# Altium footprint library Footprints.PcbLib: 67 footprints (part 3 of 5)
Each footprint in its own frame and in the unit in brackets; x right, y up, seen from the top. Pads: shape width x height; smd on the part's side, far side on the other; paste and mask are expansions set on the pad; w line width, h text height; cw(c..) or ccw(c..) is an arc to the next point about the centre after c.
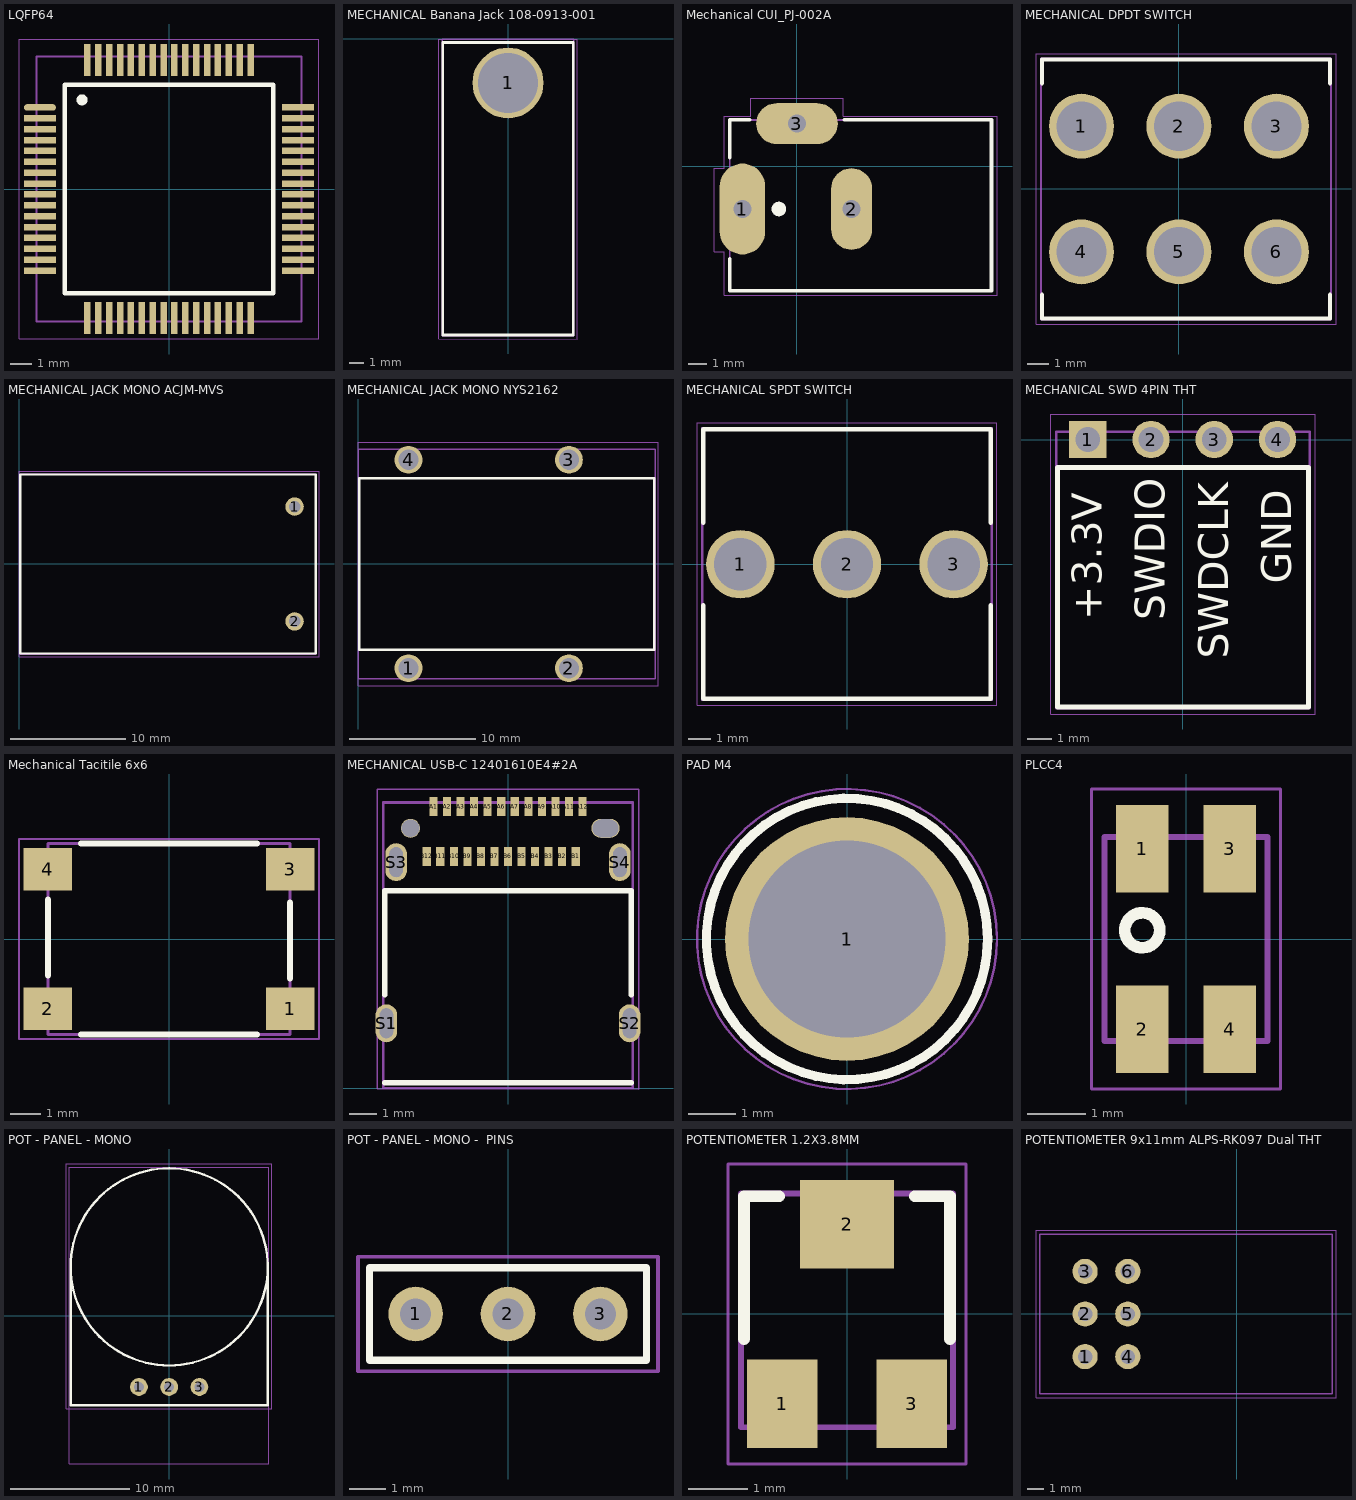
[diagram p2: the footprints below, top view; thin cyan lines are the x and y axes]

## LQFP64 [mm]
pads (64):
  oval 1.475x0.3 smd: 1(-5.938,3.75)
  rect 1.475x0.3 smd: 2(-5.938,3.25) 3(-5.938,2.75) 4(-5.938,2.25) 5(-5.938,1.75) 6(-5.938,1.25) 7(-5.938,0.75) 8(-5.938,0.25) 9(-5.938,-0.25) 10(-5.938,-0.75) 11(-5.938,-1.25) 12(-5.938,-1.75) 13(-5.938,-2.25) 14(-5.938,-2.75) 15(-5.938,-3.25) 16(-5.938,-3.75) 33(5.938,-3.75) 34(5.938,-3.25) 35(5.938,-2.75) 36(5.938,-2.25) 37(5.938,-1.75) 38(5.938,-1.25) 39(5.938,-0.75) 40(5.938,-0.25) 41(5.938,0.25) 42(5.938,0.75) 43(5.938,1.25) 44(5.938,1.75) 45(5.938,2.25) 46(5.938,2.75) 47(5.938,3.25) 48(5.938,3.75)
  rect 0.3x1.475 smd: 17(-3.75,-5.938) 18(-3.25,-5.938) 19(-2.75,-5.938) 20(-2.25,-5.938) 21(-1.75,-5.938) 22(-1.25,-5.938) 23(-0.75,-5.938) 24(-0.25,-5.938) 25(0.25,-5.938) 26(0.75,-5.938) 27(1.25,-5.938) 28(1.75,-5.938) 29(2.25,-5.938) 30(2.75,-5.938) 31(3.25,-5.938) 32(3.75,-5.938) 49(3.75,5.938) 50(3.25,5.938) 51(2.75,5.938) 52(2.25,5.938) 53(1.75,5.938) 54(1.25,5.938) 55(0.75,5.938) 56(0.25,5.938) 57(-0.25,5.938) 58(-0.75,5.938) 59(-1.25,5.938) 60(-1.75,5.938) 61(-2.25,5.938) 62(-2.75,5.938) 63(-3.25,5.938) 64(-3.75,5.938)
Top Overlay:
  circle w0.25: c-4,4.1 r0.125
  lines w0.2: -4.8,-4.8 -4.8,4.8 4.8,4.8 4.8,-4.8 -4.8,-4.8
Placement:
  lines w0.1: -6.1,-6.1 -6.1,6.1 6.1,6.1 6.1,3.856 6.1,1.106 6.1,-1.309 6.1,-3.831 6.1,-6.1 -6.1,-6.1
  text "'.Designator'" at -4,0 h1.2
Keep-Out:
  lines w0.05: -6.9,-6.9 -6.9,6.9 6.9,6.9 6.9,-6.9 -6.9,-6.9
3D body "Integrated Circuit LQFP64.STEP": height 1.62, standoff -0.01, extent -6.072,-6.072 6.072,6.072

## MECHANICAL Banana Jack 108-0913-001 [mm]
pads (1):
  round 5 hole 4.2: 1(0,-3.125)
Top Overlay:
  lines w0.2: -4.6,-20.9 4.6,-20.9 4.6,-0.275 -4.6,-0.275 -4.6,-20.9
Placement:
  lines w0.1: -4.65,-20.95 -4.65,-0.05 4.65,-0.05 4.65,-20.95 -4.65,-20.95
  text "'.Designator'" at 0.4,-19.7 h1.2
Keep-Out:
  lines w0.05: -4.875,-21.175 4.875,-21.175 4.875,-0.025 -4.875,-0.025 -4.875,-21.175
3D body "User Library-Banana plug 4mm.step": height 8.95, standoff -0.7, extent -4.65,-20.6 4.65,20.9

## Mechanical CUI_PJ-002A [mm]
pads (3):
  oval 2.5x5 hole 1 square: 1(-3,-2.35)
  oval 2.25x4.5 hole 1 square: 2(3,-2.35)
  oval 4.5x2.25 hole 1 square: 3(0,2.35)
Top Overlay:
  circle w0.4: c-1,-2.35 r0.2
  lines w0.2: -3.7,-5.1 -3.7,-6.85 10.7,-6.85 10.7,2.55 2.6,2.55 ; -3.7,0.475 -3.7,2.55 -2.6,2.55
Placement:
  lines w0.1: -3.7,-6.85 -3.7,2.55 10.7,2.55 10.7,-6.85 -3.7,-6.85
  text ".Designator" at -1.925,-2.25 h1
Keep-Out:
  lines w0.05: -4.55,-4.7 -4,-4.7 -4,-7.1 11,-7.1 11,2.75 2.55,2.75 2.55,3.75 -2.55,3.75 -2.55,2.75 -4,2.75 -4,-0.1 -4.55,-0.1 -4.55,-4.7
3D body "CUI_DEVICES_PJ-002A.step": height 11, standoff -3.5, extent -3.675,-6.85 10.725,2.55

## MECHANICAL DPDT SWITCH [mm]
pads (6):
  round 3 hole 2.3: 1(-4.5,2.9) 2(0,2.9) 3(4.5,2.9) 4(-4.5,-2.9) 5(0,-2.9) 6(4.5,-2.9)
Top Overlay:
  lines w0.2: -6.324,-4.885 -6.324,-5.976 -2.199,-5.976 6.975,-5.976 6.975,-4.885 ; -6.324,4.884 -6.324,5.975 6.975,5.975 6.975,4.884
Placement:
  lines w0.1: -6.375,-6.025 -6.375,6.025 7.025,6.025 7.025,-6.025 -6.375,-6.025
  text "'.Designator'" at -5.625,-0.275 h1.2
Keep-Out:
  lines w0.05: -6.6,-6.25 7.25,-6.25 7.25,6.25 -6.6,6.25 -6.6,-6.25
3D body "User Library-DPDT_O_N_O.STEP": height 28.83, standoff -3.17, extent -6.375,-6.032 7.024,6.033

## MECHANICAL JACK MONO ACJM-MVS [mm]
pads (2):
  round 1.6 hole 1: 1(24,5) 2(24,-5)
Top Overlay:
  lines w0.2: 0.1,-7.8 25.85,-7.8 25.85,7.8 0.1,7.8 0.1,-7.8
Placement:
  lines w0.1: 0.025,-7.85 25.9,-7.85 25.9,7.85 0.025,7.85 0.025,-7.85
  text "'.Designator'" at 1.1,-2.276 h6
Keep-Out:
  lines w0.05: 0,-8.075 0,8.075 26.125,8.075 26.125,-8.075 0,-8.075
3D body "ACJS-MN-2S.stp": height 16.8, standoff 1, extent -21.15,-7.9 25.95,7.9

## MECHANICAL JACK MONO NYS2162 [mm]
pads (4):
  round 2.2 hole 1.6: 1(4,-8.25) 2(16.7,-8.25) 3(16.7,8.25) 4(4,8.25)
Top Overlay:
  lines w0.2: 0.1,-6.8 23.45,-6.8 23.45,6.8 0.1,6.8 0.1,-6.8
Placement:
  lines w0.1: 0.025,-9.1 23.525,-9.1 23.525,9.1 0.025,9.1 0.025,-9.1
  text "'.Designator'" at 1.1,-2.276 h6
Keep-Out:
  lines w0.05: 0,-9.625 0,9.625 23.75,9.625 23.75,-9.625 0,-9.625
3D body "User Library-NMJ4HCD2.STEP": height 16.8, standoff -3.14, extent -8.264,-9.1 23.53,9.1

## MECHANICAL SPDT SWITCH [mm]
pads (3):
  round 3 hole 2.3: 1(-4.675,0) 2(0,0) 3(4.675,0)
Top Overlay:
  lines w0.2: -6.3,-1.8 -6.3,-5.9 -2.275,-5.9 6.3,-5.9 6.3,-1.8 ; -6.3,1.825 -6.3,5.925 6.3,5.925 6.3,1.825
Placement:
  lines w0.1: -6.35,-5.95 -6.35,5.975 6.35,5.975 6.35,-5.95 -6.35,-5.95
  text "'.Designator'" at -5.625,-0.275 h1.2
Keep-Out:
  lines w0.05: -6.575,-6.175 6.575,-6.175 6.575,6.2 -6.575,6.2 -6.575,-6.175
3D body "User Library-SWITCH SPDT_O_N_O.STEP": height 30.19, standoff -1.17, extent -6.35,-5.969 6.35,5.969

## MECHANICAL SWD 4PIN THT [mm]
pads (4):
  rect 1.5x1.5 hole 1: 1(-3.81,0)
  round 1.5 hole 1: 2(-1.27,0) 3(1.27,0) 4(3.81,0)
Top Overlay:
  lines w0.2: -5.025,-10.75 -5.025,-1.125 5.05,-1.125 5.05,-10.75 -5.025,-10.75
  text "GND" at 4.37,-5.8 h1.2
  text "SWDCLK" at 1.83,-8.8 h1.2
  text "SWDIO" at -0.71,-7.25 h1.2
  text "+3.3V" at -3.25,-7.25 h1.2
Placement:
  lines w0.1: -5.075,-10.8 5.1,-10.8 5.1,0.317 -5.075,0.317 -5.075,-10.8
  text "'.Designator'" at 0.575,-10.45 h1.2
Keep-Out:
  lines w0.05: -5.3,-11.025 -5.3,1.025 5.325,1.025 5.325,-11.025 -5.3,-11.025
3D body "826947-4.stp": height 3.25, standoff -3, extent -5.08,-10.8 5.08,0.315

## Mechanical Tacitile 6x6 [mm]
pads (4):
  rect 1.6x1.4 smd: 1(4,-2.3) 2(-4,-2.3) 3(4,2.3) 4(-4,2.3)
Top Overlay:
  lines w0.2: -4,-1.2 -4,1.3 ; -2.9,-3.15 2.9,-3.15 ; -2.9,3.15 2.9,3.15 ; 4,-1.3 4,1.2
Placement:
  lines w0.1: -4,-3.15 4,-3.15 4,3.15 -4,3.15 -4,-3.15
  text ".Designator" at -3.125,-0.175 h0.8
Keep-Out:
  lines w0.05: -4.95,-3.3 4.95,-3.3 4.95,3.3 -4.95,3.3 -4.95,-3.3
3D body "B3FS_1000.step": height 3, standoff -0.1, extent -4,-3.15 4,3.15

## MECHANICAL USB-C 12401610E4#2A [mm]
pads (30):
  rect 0.3x0.7 smd: A1(-2.75,10.4) A2(-2.25,10.4) A3(-1.75,10.4) A4(-1.25,10.4) A5(-0.75,10.4) A6(-0.25,10.4) A7(0.25,10.4) A8(0.75,10.4) A9(1.25,10.4) A10(1.75,10.4) A11(2.25,10.4) A12(2.75,10.4) B1(2.5,8.56) B2(2,8.56) B3(1.5,8.56) B4(1,8.56) B5(0.5,8.56) B6(0,8.56) B7(-0.5,8.56) B8(-1,8.56) B9(-1.5,8.56) B10(-2,8.56) B11(-2.5,8.56) B12(-3,8.56)
  oval 0.8x1.4 hole 1.1 slot 0.5 at 0 deg: S1(-4.49,2.4) S2(4.49,2.4) S3(-4.13,8.35) S4(4.13,8.35)
  round 0.7 hole 0.65 unplated: ""(-3.6,9.6)
  oval 1.05x0.7 hole 0.65 slot 0.95 at 0 deg unplated: ""(3.6,9.6)
Top Overlay:
  lines w0.2: -4.55,0.2 4.55,0.2 ; -4.55,3.45 -4.55,7.3 4.55,7.3 4.55,3.45
Placement:
  lines w0.1: -4.6,0 -4.6,10.55 4.6,10.55 4.6,0 -4.6,0
  text "'.Designator'" at 0.15,1 h1.2
Keep-Out:
  lines w0.05: -4.825,-0.025 4.825,-0.025 4.825,11.05 -4.825,11.05 -4.825,-0.025
3D body "M-12401610E4#2A-REVT2.stp": height 3.3, standoff -1.28, extent -4.6,0 4.6,10.55

## PAD M4 [mm]
pads (1):
  round 5.2 hole 4.2: 1(0,0)
Top Overlay:
  circle w0.2: c0,0 r3
Placement:
  text "'.Designator'" at -0.73,-0.3 h0.9
Keep-Out:
  circle w0.05: c0,0 r3.2

## PLCC4 [mm]
pads (4):
  rect 0.9x1.5 smd: 1(-0.75,1.55) 2(-0.75,-1.55) 3(0.75,1.55) 4(0.75,-1.55)
Top Overlay:
  circle w0.2: c-0.75,0.15 r0.3
Placement:
  lines w0.1: -1.4,-1.75 -1.4,1.75 1.4,1.75 1.4,-1.75 -1.4,-1.75
  text ".Designator" at -2.15,-0.4 h1.2
Keep-Out:
  lines w0.05: -1.625,-2.575 -1.625,2.575 1.625,2.575 1.625,-2.575 -1.625,-2.575
3D body "User Library-Osram_Led_PLCC4.step": height 1.95, standoff 0, extent -1.4,-1.75 1.4,1.75

## POT - PANEL - MONO [mm]
pads (3):
  round 1.5 hole 0.85: 1(-2.54,-6) 2(0,-6) 3(2.54,-6)
Top Overlay:
  circle w0.2: c0,4.085 r8.28
  lines w0.2: -8.275,4.45 -8.275,-7.55 8.275,-7.55 8.275,4.45
Placement:
  lines w0.1: -8.4,-12.471 -8.4,12.473 8.375,12.473 8.375,-12.471 -8.4,-12.471
  text "'.Designator'" at 0.1,-9.7 h1.8
Keep-Out:
  lines w0.1: -8.65,-7.85 -8.65,12.725 8.625,12.725 8.625,-7.85 -8.65,-7.85
3D body "User Library-Potentiometer.step": height 24.23, standoff 0.1, extent -8.382,-12.471 8.382,12.472

## POT - PANEL - MONO -  PINS [mm]
pads (3):
  round 1.5 hole 0.85: 1(-2.54,-6) 2(0,-6) 3(2.54,-6)
Top Overlay:
  lines w0.2: -3.81,-4.75 -3.81,-7.27 3.81,-7.27 3.81,-4.75 ; -3.81,-4.73 3.81,-4.73
Placement:
  text "'.Designator'" at -2.34,-5.4 h1.2
Keep-Out:
  lines w0.1: -4.125,-7.575 4.125,-7.575 4.125,-4.425 -4.125,-4.425 -4.125,-7.575

## POTENTIOMETER 1.2X3.8MM [mm]
pads (3):
  rect 1.2x1.5 smd: 1(-1.1,-1.525) 3(1.1,-1.525)
  rect 1.6x1.5 smd: 2(0,1.525)
Top Overlay:
  lines w0.2: -1.75,-0.425 -1.75,2 -1.15,2 ; 1.15,2 1.75,2 1.75,-0.425
Placement:
  lines w0.1: -1.8,-1.925 1.8,-1.925 1.8,2.05 -1.8,2.05 -1.8,-1.925
  text "'.Designator'" at 0.15,-1.425 h0.6
Keep-Out:
  lines w0.05: -2.025,-2.55 -2.025,2.55 2.025,2.55 2.025,-2.55 -2.025,-2.55
3D body "User Library-TC-33X-2.step": height 1.13, standoff -0.02, extent -1.8,-1.913 1.8,2.05

## POTENTIOMETER 9x11mm ALPS-RK097 Dual THT [mm]
pads (6):
  round 1.5 hole 0.85: 1(-9.04,-2.54) 2(-9.04,0) 3(-9.04,2.54) 4(-6.5,-2.54) 5(-6.5,0) 6(-6.5,2.54)
Placement:
  lines w0.1: -11.74,-4.75 5.675,-4.75 5.675,4.75 -11.74,4.75 -11.74,-4.75
  text "'.Designator'" at -8.125,-0.875 h2.4
Keep-Out:
  lines w0.05: -11.965,-4.975 -11.965,4.975 5.9,4.975 5.9,-4.975 -11.965,-4.975
3D body "pot.step": height 46.92, standoff 19.87, extent -9.207,-4.745 5.669,4.755